# Altium footprint library Footprints_SOC.PcbLib: 182 footprints (part 9 of 12)
Each footprint in its own frame and in the unit in brackets; x right, y up, seen from the top. Pads: shape width x height; smd on the part's side, far side on the other; paste and mask are expansions set on the pad; w line width, h text height; cw(c..) or ccw(c..) is an arc to the next point about the centre after c.
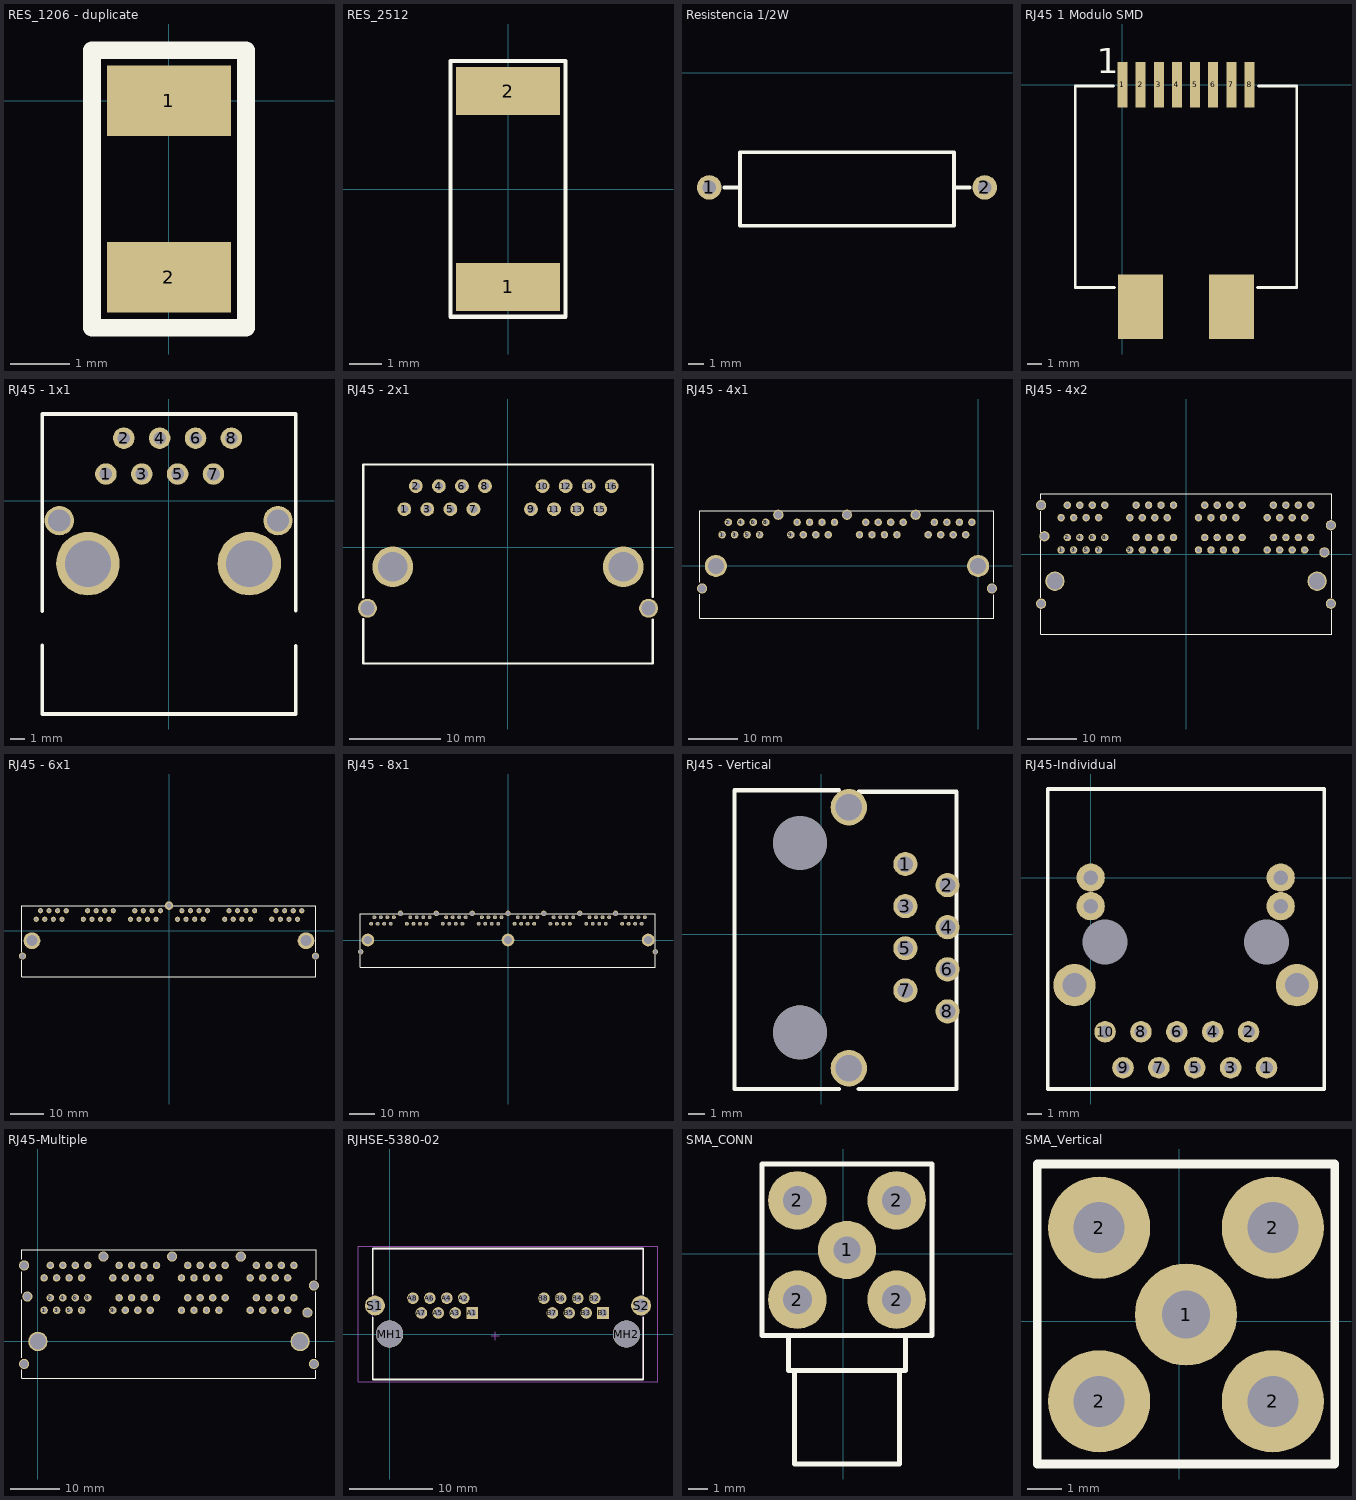
[diagram p8: the footprints below, top view; thin cyan lines are the x and y axes]

## RES_1206 - duplicate [mm] "RES 1206"
pads (2):
  rect 2.1x1.2 smd: 1(0,0) 2(0,-3)
Top Overlay:
  lines w0.3: -1.31,-3.86 1.31,-3.86 1.31,0.86 -1.31,0.86 -1.31,-3.86
3D body "Resistencia 1206.step": height 0.6, standoff 0, extent -0.8,-3.1 0.8,0.1

## RES_2512 [mm] "RES 2512"
pads (2):
  rect 3.2x1.475 smd: 1(0,-3.012) 2(0,3.013)
Top Overlay:
  lines w0.127: -1.77,-3.93 -1.77,3.94 1.76,3.94 1.76,-3.93 -1.77,-3.93
3D body "resistencia 2512.stp": height 0.67, standoff 0.03, extent -1.588,-3.175 1.587,3.175

## Resistencia 1/2W [mm] "Through Hole"
pads (2):
  round 1.6 hole 0.9: 1(-27.5,-7.5) 2(-9.5,-7.5)
Top Overlay:
  lines w0.254: -26.5,-7.5 -25.5,-7.5 ; -11.5,-7.5 -10.5,-7.5 ; -25.5,-10 -11.5,-10 -11.5,-5.2 -25.5,-5.2 -25.5,-10
3D body "Resistencia 0.5W.STEP": height 4.72, standoff -2.67, extent -27.771,-9.97 -9.286,-5.19

## RJ45 1 Modulo SMD [mm] "smd WURTH"
height 27
pads (10):
  rect 0.7x3.2 smd: 1(0,0) 2(1.27,0) 3(2.54,0) 4(3.81,0) 5(5.08,0) 6(6.35,0) 7(7.62,0) 8(8.89,0)
  rect 3.15x4.5 smd: ""(1.27,-15.55) ""(7.62,-15.55)
Top Overlay:
  lines w0.2: -0.62,-0.1 -3.31,-0.1 -3.31,-14.2 -0.56,-14.2 ; 9.45,-14.2 12.2,-14.2 12.2,-0.1 9.51,-0.1
  text "1" at -1.8,0.2 h3
3D body "RJ-45 1 MODULO SMD.stp": height 12.7, standoff 0, extent -3.32,-16.64 12.23,1.36

## RJ45 - 1x1 [mil] "1 conector RJ-45"
height 1062.99
pads (12):
  round 60 hole 35: 1(-175,75) 2(-125,175) 3(-75,75) 4(-25,175) 5(25,75) 6(75,175) 7(125,75) 8(175,175)
  round 82 hole 62: ""(-304.92,-54.92) ""(304.92,-54.92)
  round 177.17 hole 129: ""(-225,-175) ""(225,-175)
Top Overlay:
  lines w10: -353,-403 -353,-594.29 354.92,-594.29 354.92,-404 ; -353,-307 -353,242.35 354.92,242.35 354.92,-306
3D body "RJ-45 modulo horizontal.stp": height 580.59, standoff -145.41, extent -345.63,-597.65 352.55,242.35

## RJ45 - 2x1 [mil] "2 conectores RJ-45"
height 1062.99
pads (20):
  round 60 hole 35: 1(-450,164.96) 2(-400,264.96) 3(-350,164.96) 4(-300,264.96) 5(-250,164.96) 6(-200,264.96) 7(-150,164.96) 8(-100,264.96) 9(100,164.96) 10(150,264.96) 11(200,164.96) 12(250,264.96) 13(300,164.96) 14(350,264.96) 15(400,164.96) 16(450,264.96)
  round 82 hole 62: ""(-609.84,-264.96) ""(609.84,-264.96)
  round 177.17 hole 129: ""(-500,-85.04) ""(500,-85.04)
Top Overlay:
  lines w10: -628,-313.04 -628,-504.33 627.99,-504.33 627.99,-314.04 ; -628,-217.04 -628,358.66 627.99,358.66 627.99,-216.04
3D body "rj-45 2x1.stp": height 577.84, standoff -150.41, extent -648.69,-508.5 654.2,331.5

## RJ45 - 4x1 [mil] "4 conectores RJ-45"
height 1062.99
pads (39):
  round 60 hole 35: 1(-2050,250) 2(-2000,350) 3(-1950,250) 4(-1900,350) 5(-1850,250) 6(-1800,350) 7(-1750,250) 8(-1700,350) 9(-1500,250) 10(-1450,350) 11(-1400,250) 12(-1350,350) 13(-1300,250) 14(-1250,350) 15(-1200,250) 16(-1150,350) 17(-950,250) 18(-900,350) 19(-850,250) 20(-800,350) 21(-750,250) 22(-700,350) 23(-650,250) 24(-600,350) 25(-400,250) 26(-350,350) 27(-300,250) 28(-250,350) 29(-200,250) 30(-150,350) 31(-100,250) 32(-50,350)
  round 82 hole 62: ""(-2210,-180) ""(-1600,409.84) ""(-1050,409.84) ""(-500,409.84) ""(110,-180)
  round 177.17 hole 129: ""(-2100,0) ""(0,0)
Top Overlay:
  lines w10: -2228,-228 -2228,-419.29 126,-419.29 126,-229 ; -2228,-132 -2228,443.7 124.82,443.7 126,442.52 126,-131
3D body "rj-45 4x1.stp": height 592.9, standoff -145.71, extent -2261.42,-421.54 164.71,442.01

## RJ45 - 4x2 [mil] "P/N: 1-1734715-2"
height 1062.99
pads (72):
  round 60 hole 35: 1(-1000,35.5) 2(-950,135.5) 3(-900,35.5) 4(-850,135.5) 5(-800,35.5) 6(-750,135.5) 7(-700,35.5) 8(-650,135.5) 9(-450,35.5) 10(-400,135.5) 11(-350,35.5) 12(-300,135.5) 13(-250,35.5) 14(-200,135.5) 15(-150,35.5) 16(-100,135.5) 17(100,35.5) 18(150,135.5) 19(200,35.5) 20(250,135.5) 21(300,35.5) 22(350,135.5) 23(400,35.5) 24(450,135.5) 25(650,35.5) 26(700,135.5) 27(750,35.5) 28(800,135.5) 29(850,35.5) 30(900,135.5) 31(950,35.5) 32(1000,135.5) 33(1000,394.5) 34(950,294.5) 35(900,394.5) 36(850,294.5) 37(800,394.5) 38(750,294.5) 39(700,394.5) 40(650,294.5) 41(450,394.5) 42(400,294.5) 43(350,394.5) 44(300,294.5) 45(250,394.5) 46(200,294.5) 47(150,394.5) 48(100,294.5) 49(-100,394.5) 50(-150,294.5) 51(-200,394.5) 52(-250,294.5) 53(-300,394.5) 54(-350,294.5) 55(-400,394.5) 56(-450,294.5) 57(-650,394.5) 58(-700,294.5) 59(-750,394.5) 60(-800,294.5) 61(-850,394.5) 62(-900,294.5) 63(-950,394.5) 64(-1000,294.5)
  round 82 hole 62: ""(-1160,-394.5) ""(-1160,394.5) ""(-1134,145.5) ""(1108,16.5) ""(1160,-394.5) ""(1160,233.5)
  round 155 hole 129: ""(-1050,-214.5) ""(1050,-214.5)
Top Overlay:
  lines w10: -1164.23,-442.5 -1164.23,-639.7 1168.44,-639.7 1168.44,-443.5 ; -1164.23,-346.5 -1164.23,118.5 ; -1164.23,173.5 -1164.23,345.5 ; -1164.23,442.5 -1164.23,486.29 1168.44,486.29 1168.44,281.5 ; 1168.44,-345.5 1168.44,185.5
3D body "rj-45 4x2 horizontal (1-1734715-2).stp": height 1076.72, standoff -95.67, extent -1191.73,-639.7 1195.96,486.29

## RJ45 - 6x1 [mil] "6 conectores RJ-45 P/N: 5558525-1"
height 1062.99
pads (53):
  round 60 hole 35: 1(-1550,135.08) 2(-1500,235.08) 3(-1450,135.08) 4(-1400,235.08) 5(-1350,135.08) 6(-1300,235.08) 7(-1250,135.08) 8(-1200,235.08) 9(-1000,135.08) 10(-950,235.08) 11(-900,135.08) 12(-850,235.08) 13(-800,135.08) 14(-750,235.08) 15(-700,135.08) 16(-650,235.08) 17(-450,135.08) 18(-400,235.08) 19(-350,135.08) 20(-300,235.08) 21(-250,135.08) 22(-200,235.08) 23(-150,135.08) 24(-100,235.08) 25(100,135.08) 26(150,235.08) 27(200,135.08) 28(250,235.08) 29(300,135.08) 30(350,235.08) 31(400,135.08) 32(450,235.08) 34(700,235.08) 35(750,135.08) 36(800,235.08) 37(850,135.08) 38(900,235.08) 39(950,135.08) 40(1000,235.08) 41(1200,135.08) 42(1250,235.08) 43(1300,135.08) 44(1350,235.08) 45(1400,135.08) 46(1450,235.08) 47(1500,135.08) 48(1550,235.08)
  round 60 hole 35 paste+0: 33(650,135.08)
  round 82 hole 62: ""(-1710,-294.92) ""(1710,-294.92)
  round 196.85 hole 129: ""(-1600,-114.92) ""(1600,-114.92)
  round 98.43 hole 62: ""(0,294.92)
Top Overlay:
  lines w10: -1716.54,-342.92 -1716.54,-534.21 1712.99,-534.21 1712.99,-343.92 ; -1716.54,-246.92 -1716.54,290.2 1714.81,290.2 1714.81,-245.92
3D body "rj-45 6x1 5558525-1.stp": height 586.59, standoff -147.91, extent -1714.79,-539.9 1714.81,300.1

## RJ45 - 8x1 [mil] "8 conectores RJ-45"
height 1062.99
pads (76):
  round 60 hole 35: 1(-2100,250) 2(-2050,350) 3(-2000,250) 4(-1950,350) 5(-1900,250) 6(-1850,350) 7(-1800,250) 8(-1750,350) 9(-1550,250) 10(-1500,350) 11(-1450,250) 12(-1400,350) 13(-1350,250) 14(-1300,350) 15(-1250,250) 16(-1200,350) 17(-1000,250) 18(-950,350) 19(-900,250) 20(-850,350) 21(-800,250) 22(-750,350) 23(-700,250) 24(-650,350) 25(-450,250) 26(-400,350) 27(-350,250) 28(-300,350) 29(-250,250) 30(-200,350) 31(-150,250) 32(-100,350) 34(150,350) 35(200,250) 36(250,350) 37(300,250) 38(350,350) 39(400,250) 40(450,350) 41(650,250) 42(700,350) 43(750,250) 44(800,350) 45(850,250) 46(900,350) 47(950,250) 48(1000,350) 49(1200,250) 50(1250,350) 51(1300,250) 52(1350,350) 53(1400,250) 54(1450,350) 55(1500,250) 56(1550,350) 57(1750,250) 58(1800,350) 59(1850,250) 60(1900,350) 61(1950,250) 62(2000,350) 63(2050,250) 64(2100,350)
  round 60 hole 35 paste+0: 33(100,250)
  round 82 hole 62: ""(-2260,-180) ""(-1650,409.84) ""(-1100,409.84) ""(-550,409.84) ""(0,409.84) ""(550,409.84) ""(1100,409.84) ""(1650,409.84) ""(2259.84,-180)
  round 196.85 hole 129: ""(-2150,0) ""(0,0) ""(2150,0)
Top Overlay:
  lines w10: -2266.54,-228 -2266.54,-419.29 2259.84,-419.29 2259.84,-229 ; -2266.54,-132 -2266.54,405.12 2259.84,405.12 2259.84,-131
3D body "rj-45 8x1.stp": height 531.59, standoff -135.41, extent -2251.18,-413.54 2248.82,396.46

## RJ45 - Vertical [mil] "1 conector RJ-45 Through Hole TE Connectivty (100616-2)"
height 1062.99
pads (12):
  round 57.4 hole 37 mask+0: 1(199.76,166.5) 2(299.76,116.5) 3(199.76,66.5) 4(299.76,16.5) 5(199.76,-33.5) 6(299.76,-83.5) 7(199.76,-133.5) 8(299.76,-183.5)
  round 128 hole 128 unplated: ""(-50.63,-233.5) ""(-50.63,216.5)
  round 86.61 hole 63: ""(65.51,-318.5) ""(65.51,301.5)
Top Overlay:
  lines w10: 42.11,-367.83 -206.3,-367.83 -206.3,342.01 42.11,342.01 ; 88.91,-367.83 321.26,-367.83 321.26,338.03 88.91,338.03
3D body "RJ-45 modulo vertical through hole (100616-2).stp": height 629.92, standoff -151.57, extent -206.3,-368.06 321.26,340.6

## RJ45-Individual [mm] "Wurth Elektronik"
height 27
pads (18):
  round 1.524 hole 0.889: 1(12.445,-13.46) 2(11.175,-10.92) 3(9.905,-13.46) 4(8.635,-10.92) 5(7.365,-13.46) 6(6.095,-10.92) 7(4.825,-13.46) 8(3.555,-10.92) 9(2.285,-13.46) 10(1.015,-10.92)
  round 3 hole 1.7: ""(-1.15,-7.62) ""(14.6,-7.62)
  round 2 hole 1.02: ""(0,-2.03) ""(0,0) ""(13.45,-2.03) ""(13.45,0)
  round 3 hole 3.2: ""(1.01,-4.57) ""(12.44,-4.57)
Top Overlay:
  lines w0.254: -3.03,-14.97 16.52,-14.97 16.52,6.27 -3.03,6.27 -3.03,-14.97
3D body "RJ-45 Wurth Elektronik.stp": height 15.5, standoff -2.82, extent -2.974,-14.99 16.474,6.31

## RJ45-Multiple [mil] "8 Channel CAT5 Connector"
height 1062.99
pads (75):
  round 60 hole 35: 1(50,250) 2(100,350) 3(150,250) 4(200,350) 5(250,250) 6(300,350) 7(350,250) 8(400,350) 9(600,250) 10(650,350) 11(700,250) 12(750,350) 13(800,250) 14(850,350) 15(900,250) 16(950,350) 17(1150,250) 18(1200,350) 19(1250,250) 20(1300,350) 21(1350,250) 22(1400,350) 23(1450,250) 24(1500,350) 25(1700,250) 26(1750,350) 27(1800,250) 28(1850,350) 29(1900,250) 30(1950,350) 31(2000,250) 32(2050,350) 33(2050,609) 34(2000,509) 35(1950,609) 36(1900,509) 37(1850,609) 38(1800,509) 39(1750,609) 40(1700,509) 41(1500,609) 42(1450,509) 43(1400,609) 44(1350,509) 45(1300,609) 46(1250,509) 47(1200,609) 48(1150,509) 49(950,609) 50(900,509) 51(850,609) 52(800,509) 53(750,609) 54(700,509) 55(650,609) 56(600,509) 57(400,609) 58(350,509) 59(300,609) 60(250,509) 61(200,609) 62(150,509) 63(100,609) 64(50,509)
  round 82 hole 62: ""(-110,-180) ""(-110,609) ""(-84,360) ""(525,680) ""(1075,680) ""(1625,680) ""(2158,231) ""(2210,-180) ""(2210,448)
  round 155 hole 129: ""(0,0) ""(2100,0)
Top Overlay:
  lines w10: -128,-228 -128,-295 2226,-295 2226,-229 ; -128,-132 -128,333 ; -128,657 -128,735 2228,735 2228,496 ; -127,388 -127,560 ; 2226,-131 2226,400
3D body "70042890.stp": height 1037.5, standoff -157.3, extent -165,-415 2245,705

## RJHSE-5380-02 [mm] "Modular Jack Horizontal Shielded Dual Port 8P8C Tab Up"
height 13.75
pads (20):
  rect 1.4x1.4 hole 0.9: A1(9.906,2.54) B1(25.654,2.54)
  round 1.4 hole 0.9: A2(8.89,4.318) A3(7.874,2.54) A4(6.858,4.318) A5(5.842,2.54) A6(4.826,4.318) A7(3.81,2.54) A8(2.794,4.318) B2(24.638,4.318) B3(23.622,2.54) B4(22.606,4.318) B5(21.59,2.54) B6(20.574,4.318) B7(19.558,2.54) B8(18.542,4.318)
  round 3.25 hole 3.25 unplated: MH1(0,0) MH2(28.448,0)
  round 2.4 hole 1.6: S1(-1.778,3.429) S2(30.226,3.429)
Top Overlay:
  lines w0.203: -2.032,2.032 -2.032,-5.461 30.48,-5.461 30.48,2.032 ; -2.032,4.826 -2.032,10.287 30.48,10.287 30.48,4.826
Mechanical 5:
  lines w0.1: -2.032,-5.461 -2.032,10.287 30.48,10.287 30.48,-5.461 -2.032,-5.461
  text ".Designator" at 12.7,-0.215 h1.02
Mechanical 15:
  lines w0.05: 12.2,-0.215 13.2,-0.215 ; 12.7,-0.715 12.7,0.285 ; -3.81,-5.715 -3.81,10.541 32.258,10.541 32.258,-5.715 -3.81,-5.715
3D body "RJHSE-5380-02-REVT1.step": height 15.06, standoff -3.78, extent -3.503,-5.41 31.951,10.287

## SMA_CONN [mm]
pads (5):
  round 3 hole 1.4: 1(0.2,0.2)
  round 3 hole 1.5: 2(-2.35,-2.35) 2(-2.35,2.75) 2(2.75,-2.35) 2(2.75,2.75)
Top Overlay:
  lines w0.254: -2.8,-4.21 -2.8,-6 ; -2.5,-6 -2.5,-10.8 2.9,-10.8 2.9,-6 ; 3.2,-4.21 3.2,-6 -2.8,-6 ; -2.8,-6 -2.8,-6 ; -4.17,-4.19 4.57,-4.19 4.57,4.62 -4.17,4.62 -4.17,-4.19
3D body "SMA.stp": height 11.18, standoff -2.66, extent -3,-10.75 3.35,3.45

## SMA_Vertical [mm]
pads (5):
  round 3 hole 1.4: 1(0.2,0.2)
  round 3 hole 1.5: 2(-2.35,-2.35) 2(-2.35,2.75) 2(2.75,-2.35) 2(2.75,2.75)
Top Overlay:
  lines w0.254: -4.17,-4.19 4.57,-4.19 4.57,4.62 -4.17,4.62 -4.17,-4.19
3D body "SMA vertical.step": height 9.72, standoff -3.81, extent -2.975,-2.975 3.375,3.375